# Altium integrated library ISSI SRAM QUAD(P).IntLib: 1732 symbols (part 138 of 1459)
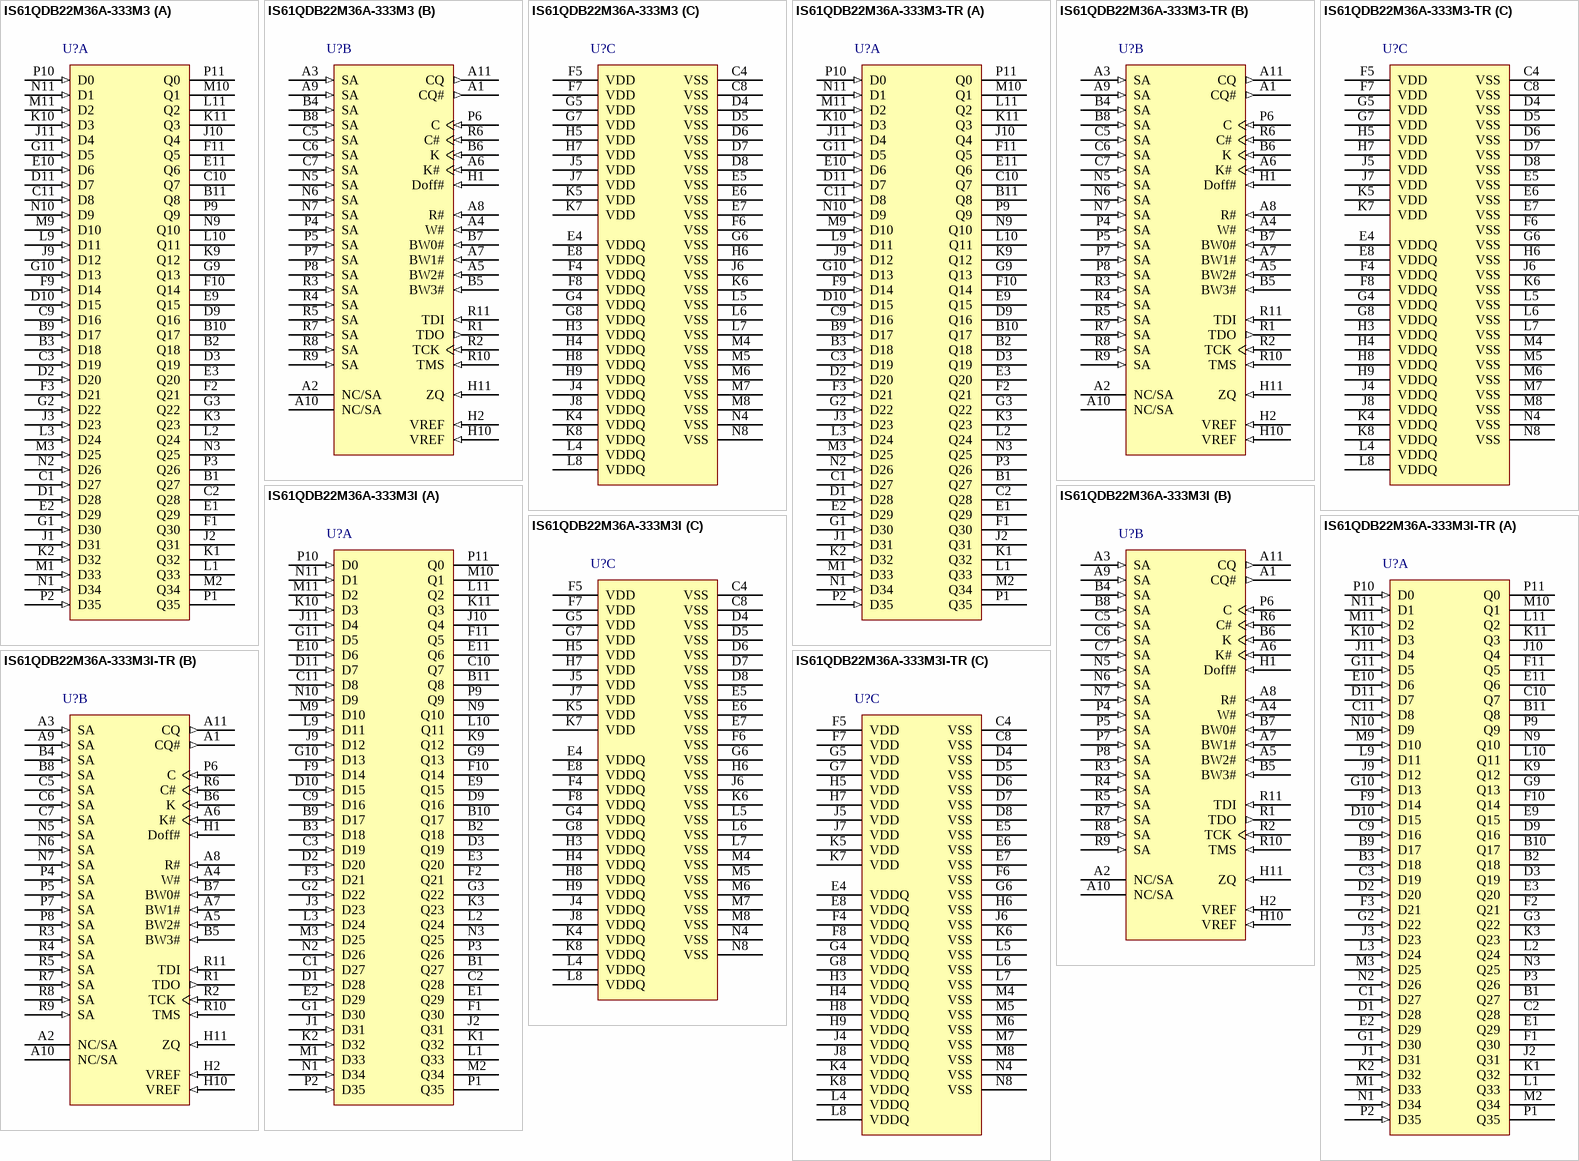
[diagram p536: symbols IS61QDB22M36A-333M3 to IS61QDB22M36A-333M3I-TR]

## IS61QDB22M36A-333M3-TR
designator U?
72 M QUAD (Burst 2) Synchronous SRAM, 2 M x 36, 0 to 70 degC, 165-Pin BGA (LF-BGA-165); Manufacturer: Integrated Silicon Solution Inc (ISSI); PartNumber: IS61QDB22M36A-333M3-TR; Burst: 2; Density: 72M; Organization: 2Mx36; Packing: Tape & Reel; DatasheetVersion: Rev. A; PackageVersion: Rev. B, 12/2007; PackageReference: LF-BGA-165; PackageDescription: 165-Pin 15 x 17 mm LF-BGA, Pitch 1 mm; Mounting Technology: Surface Mount; ComponentLink1Description: Manufacturer URL; ComponentLink1URL: http://www.issi.com/US/index.shtml; ComponentLink2Description: Datasheet; ComponentLink2URL: http://www.issi.com/WW/pdf/61QDB24M18A-2M36A.pdf; ComponentLink3Description: Package Specification; ComponentLink3URL: http://www.issi.com/WW/pdf/61QDB41M18A-51236A.pdf
footprint ISSI-LF-BGA-165-15000X17000DE (BGA, 165-Balls, Body 17x15mm, Pitch 1mm)
part A pins: B1 Q27 (hiz) "Synchronous data output: Output data is synchronized to the respective C and C#, or to the respective K and K# if C and /C are tied to high. This bus operates in response to R# commands.See BALL CONFIGURATION figures for (See Datasheet)", B2 Q18 (hiz) "Synchronous data output: Output data is synchronized to the respective C and C#, or to the respective K and K# if C and /C are tied to high. This bus operates in response to R# commands.See BALL CONFIGURATION figures for (See Datasheet)", B3 D18 (in) "Synchronous data input: Input data must meet setup and hold times around the rising edges of K and K# during WRITE operations. See BALL CONFIGURATION figures for ball site location of individual signals.", B9 D17 (in) "Synchronous data input: Input data must meet setup and hold times around the rising edges of K and K# during WRITE operations. See BALL CONFIGURATION figures for ball site location of individual signals.", B10 Q17 (hiz) "Synchronous data output: Output data is synchronized to the respective C and C#, or to the respective K and K# if C and /C are tied to high. This bus operates in response to R# commands.See BALL CONFIGURATION figures for (See Datasheet)", B11 Q8 (hiz) "Synchronous data output: Output data is synchronized to the respective C and C#, or to the respective K and K# if C and /C are tied to high. This bus operates in response to R# commands.See BALL CONFIGURATION figures for (See Datasheet)", C1 D27 (in) "Synchronous data input: Input data must meet setup and hold times around the rising edges of K and K# during WRITE operations. See BALL CONFIGURATION figures for ball site location of individual signals.", C2 Q28 (hiz) "Synchronous data output: Output data is synchronized to the respective C and C#, or to the respective K and K# if C and /C are tied to high. This bus operates in response to R# commands.See BALL CONFIGURATION figures for (See Datasheet)", C3 D19 (in) "Synchronous data input: Input data must meet setup and hold times around the rising edges of K and K# during WRITE operations. See BALL CONFIGURATION figures for ball site location of individual signals.", C9 D16 (in) "Synchronous data input: Input data must meet setup and hold times around the rising edges of K and K# during WRITE operations. See BALL CONFIGURATION figures for ball site location of individual signals.", C10 Q7 (hiz) "Synchronous data output: Output data is synchronized to the respective C and C#, or to the respective K and K# if C and /C are tied to high. This bus operates in response to R# commands.See BALL CONFIGURATION figures for (See Datasheet)", C11 D8 (in) "Synchronous data input: Input data must meet setup and hold times around the rising edges of K and K# during WRITE operations. See BALL CONFIGURATION figures for ball site location of individual signals.", D1 D28 (in) "Synchronous data input: Input data must meet setup and hold times around the rising edges of K and K# during WRITE operations. See BALL CONFIGURATION figures for ball site location of individual signals.", D2 D20 (in) "Synchronous data input: Input data must meet setup and hold times around the rising edges of K and K# during WRITE operations. See BALL CONFIGURATION figures for ball site location of individual signals.", D3 Q19 (hiz) "Synchronous data output: Output data is synchronized to the respective C and C#, or to the respective K and K# if C and /C are tied to high. This bus operates in response to R# commands.See BALL CONFIGURATION figures for (See Datasheet)", D9 Q16 (hiz) "Synchronous data output: Output data is synchronized to the respective C and C#, or to the respective K and K# if C and /C are tied to high. This bus operates in response to R# commands.See BALL CONFIGURATION figures for (See Datasheet)", D10 D15 (in) "Synchronous data input: Input data must meet setup and hold times around the rising edges of K and K# during WRITE operations. See BALL CONFIGURATION figures for ball site location of individual signals.", D11 D7 (in) "Synchronous data input: Input data must meet setup and hold times around the rising edges of K and K# during WRITE operations. See BALL CONFIGURATION figures for ball site location of individual signals.", E1 Q29 (hiz) "Synchronous data output: Output data is synchronized to the respective C and C#, or to the respective K and K# if C and /C are tied to high. This bus operates in response to R# commands.See BALL CONFIGURATION figures for (See Datasheet)", E2 D29 (in) "Synchronous data input: Input data must meet setup and hold times around the rising edges of K and K# during WRITE operations. See BALL CONFIGURATION figures for ball site location of individual signals.", E3 Q20 (hiz) "Synchronous data output: Output data is synchronized to the respective C and C#, or to the respective K and K# if C and /C are tied to high. This bus operates in response to R# commands.See BALL CONFIGURATION figures for (See Datasheet)", E9 Q15 (hiz) "Synchronous data output: Output data is synchronized to the respective C and C#, or to the respective K and K# if C and /C are tied to high. This bus operates in response to R# commands.See BALL CONFIGURATION figures for (See Datasheet)", E10 D6 (in) "Synchronous data input: Input data must meet setup and hold times around the rising edges of K and K# during WRITE operations. See BALL CONFIGURATION figures for ball site location of individual signals.", E11 Q6 (hiz) "Synchronous data output: Output data is synchronized to the respective C and C#, or to the respective K and K# if C and /C are tied to high. This bus operates in response to R# commands.See BALL CONFIGURATION figures for (See Datasheet)", F1 Q30 (hiz) "Synchronous data output: Output data is synchronized to the respective C and C#, or to the respective K and K# if C and /C are tied to high. This bus operates in response to R# commands.See BALL CONFIGURATION figures for (See Datasheet)", F2 Q21 (hiz) "Synchronous data output: Output data is synchronized to the respective C and C#, or to the respective K and K# if C and /C are tied to high. This bus operates in response to R# commands.See BALL CONFIGURATION figures for (See Datasheet)", F3 D21 (in) "Synchronous data input: Input data must meet setup and hold times around the rising edges of K and K# during WRITE operations. See BALL CONFIGURATION figures for ball site location of individual signals.", F9 D14 (in) "Synchronous data input: Input data must meet setup and hold times around the rising edges of K and K# during WRITE operations. See BALL CONFIGURATION figures for ball site location of individual signals.", F10 Q14 (hiz) "Synchronous data output: Output data is synchronized to the respective C and C#, or to the respective K and K# if C and /C are tied to high. This bus operates in response to R# commands.See BALL CONFIGURATION figures for (See Datasheet)", F11 Q5 (hiz) "Synchronous data output: Output data is synchronized to the respective C and C#, or to the respective K and K# if C and /C are tied to high. This bus operates in response to R# commands.See BALL CONFIGURATION figures for (See Datasheet)", G1 D30 (in) "Synchronous data input: Input data must meet setup and hold times around the rising edges of K and K# during WRITE operations. See BALL CONFIGURATION figures for ball site location of individual signals.", G2 D22 (in) "Synchronous data input: Input data must meet setup and hold times around the rising edges of K and K# during WRITE operations. See BALL CONFIGURATION figures for ball site location of individual signals.", G3 Q22 (hiz) "Synchronous data output: Output data is synchronized to the respective C and C#, or to the respective K and K# if C and /C are tied to high. This bus operates in response to R# commands.See BALL CONFIGURATION figures for (See Datasheet)", G9 Q13 (hiz) "Synchronous data output: Output data is synchronized to the respective C and C#, or to the respective K and K# if C and /C are tied to high. This bus operates in response to R# commands.See BALL CONFIGURATION figures for (See Datasheet)", G10 D13 (in) "Synchronous data input: Input data must meet setup and hold times around the rising edges of K and K# during WRITE operations. See BALL CONFIGURATION figures for ball site location of individual signals.", G11 D5 (in) "Synchronous data input: Input data must meet setup and hold times around the rising edges of K and K# during WRITE operations. See BALL CONFIGURATION figures for ball site location of individual signals.", J1 D31 (in) "Synchronous data input: Input data must meet setup and hold times around the rising edges of K and K# during WRITE operations. See BALL CONFIGURATION figures for ball site location of individual signals.", J2 Q31 (hiz) "Synchronous data output: Output data is synchronized to the respective C and C#, or to the respective K and K# if C and /C are tied to high. This bus operates in response to R# commands.See BALL CONFIGURATION figures for (See Datasheet)", J3 D23 (in) "Synchronous data input: Input data must meet setup and hold times around the rising edges of K and K# during WRITE operations. See BALL CONFIGURATION figures for ball site location of individual signals.", J9 D12 (in) "Synchronous data input: Input data must meet setup and hold times around the rising edges of K and K# during WRITE operations. See BALL CONFIGURATION figures for ball site location of individual signals.", J10 Q4 (hiz) "Synchronous data output: Output data is synchronized to the respective C and C#, or to the respective K and K# if C and /C are tied to high. This bus operates in response to R# commands.See BALL CONFIGURATION figures for (See Datasheet)", J11 D4 (in) "Synchronous data input: Input data must meet setup and hold times around the rising edges of K and K# during WRITE operations. See BALL CONFIGURATION figures for ball site location of individual signals.", K1 Q32 (hiz) "Synchronous data output: Output data is synchronized to the respective C and C#, or to the respective K and K# if C and /C are tied to high. This bus operates in response to R# commands.See BALL CONFIGURATION figures for (See Datasheet)", K2 D32 (in) "Synchronous data input: Input data must meet setup and hold times around the rising edges of K and K# during WRITE operations. See BALL CONFIGURATION figures for ball site location of individual signals.", K3 Q23 (hiz) "Synchronous data output: Output data is synchronized to the respective C and C#, or to the respective K and K# if C and /C are tied to high. This bus operates in response to R# commands.See BALL CONFIGURATION figures for (See Datasheet)", K9 Q12 (hiz) "Synchronous data output: Output data is synchronized to the respective C and C#, or to the respective K and K# if C and /C are tied to high. This bus operates in response to R# commands.See BALL CONFIGURATION figures for (See Datasheet)", K10 D3 (in) "Synchronous data input: Input data must meet setup and hold times around the rising edges of K and K# during WRITE operations. See BALL CONFIGURATION figures for ball site location of individual signals.", K11 Q3 (hiz) "Synchronous data output: Output data is synchronized to the respective C and C#, or to the respective K and K# if C and /C are tied to high. This bus operates in response to R# commands.See BALL CONFIGURATION figures for (See Datasheet)", L1 Q33 (hiz) "Synchronous data output: Output data is synchronized to the respective C and C#, or to the respective K and K# if C and /C are tied to high. This bus operates in response to R# commands.See BALL CONFIGURATION figures for (See Datasheet)", L2 Q24 (hiz) "Synchronous data output: Output data is synchronized to the respective C and C#, or to the respective K and K# if C and /C are tied to high. This bus operates in response to R# commands.See BALL CONFIGURATION figures for (See Datasheet)", L3 D24 (in) "Synchronous data input: Input data must meet setup and hold times around the rising edges of K and K# during WRITE operations. See BALL CONFIGURATION figures for ball site location of individual signals.", L9 D11 (in) "Synchronous data input: Input data must meet setup and hold times around the rising edges of K and K# during WRITE operations. See BALL CONFIGURATION figures for ball site location of individual signals.", L10 Q11 (hiz) "Synchronous data output: Output data is synchronized to the respective C and C#, or to the respective K and K# if C and /C are tied to high. This bus operates in response to R# commands.See BALL CONFIGURATION figures for (See Datasheet)", L11 Q2 (hiz) "Synchronous data output: Output data is synchronized to the respective C and C#, or to the respective K and K# if C and /C are tied to high. This bus operates in response to R# commands.See BALL CONFIGURATION figures for (See Datasheet)", M1 D33 (in) "Synchronous data input: Input data must meet setup and hold times around the rising edges of K and K# during WRITE operations. See BALL CONFIGURATION figures for ball site location of individual signals.", M2 Q34 (hiz) "Synchronous data output: Output data is synchronized to the respective C and C#, or to the respective K and K# if C and /C are tied to high. This bus operates in response to R# commands.See BALL CONFIGURATION figures for (See Datasheet)", M3 D25 (in) "Synchronous data input: Input data must meet setup and hold times around the rising edges of K and K# during WRITE operations. See BALL CONFIGURATION figures for ball site location of individual signals.", M9 D10 (in) "Synchronous data input: Input data must meet setup and hold times around the rising edges of K and K# during WRITE operations. See BALL CONFIGURATION figures for ball site location of individual signals.", M10 Q1 (hiz) "Synchronous data output: Output data is synchronized to the respective C and C#, or to the respective K and K# if C and /C are tied to high. This bus operates in response to R# commands.See BALL CONFIGURATION figures for (See Datasheet)", M11 D2 (in) "Synchronous data input: Input data must meet setup and hold times around the rising edges of K and K# during WRITE operations. See BALL CONFIGURATION figures for ball site location of individual signals.", N1 D34 (in) "Synchronous data input: Input data must meet setup and hold times around the rising edges of K and K# during WRITE operations. See BALL CONFIGURATION figures for ball site location of individual signals.", N2 D26 (in) "Synchronous data input: Input data must meet setup and hold times around the rising edges of K and K# during WRITE operations. See BALL CONFIGURATION figures for ball site location of individual signals.", N3 Q25 (hiz) "Synchronous data output: Output data is synchronized to the respective C and C#, or to the respective K and K# if C and /C are tied to high. This bus operates in response to R# commands.See BALL CONFIGURATION figures for (See Datasheet)", N9 Q10 (hiz) "Synchronous data output: Output data is synchronized to the respective C and C#, or to the respective K and K# if C and /C are tied to high. This bus operates in response to R# commands.See BALL CONFIGURATION figures for (See Datasheet)", N10 D9 (in) "Synchronous data input: Input data must meet setup and hold times around the rising edges of K and K# during WRITE operations. See BALL CONFIGURATION figures for ball site location of individual signals.", N11 D1 (in) "Synchronous data input: Input data must meet setup and hold times around the rising edges of K and K# during WRITE operations. See BALL CONFIGURATION figures for ball site location of individual signals.", P1 Q35 (hiz) "Synchronous data output: Output data is synchronized to the respective C and C#, or to the respective K and K# if C and /C are tied to high. This bus operates in response to R# commands.See BALL CONFIGURATION figures for (See Datasheet)", P2 D35 (in) "Synchronous data input: Input data must meet setup and hold times around the rising edges of K and K# during WRITE operations. See BALL CONFIGURATION figures for ball site location of individual signals.", P3 Q26 (hiz) "Synchronous data output: Output data is synchronized to the respective C and C#, or to the respective K and K# if C and /C are tied to high. This bus operates in response to R# commands.See BALL CONFIGURATION figures for (See Datasheet)", P9 Q9 (hiz) "Synchronous data output: Output data is synchronized to the respective C and C#, or to the respective K and K# if C and /C are tied to high. This bus operates in response to R# commands.See BALL CONFIGURATION figures for (See Datasheet)", P10 D0 (in) "Synchronous data input: Input data must meet setup and hold times around the rising edges of K and K# during WRITE operations. See BALL CONFIGURATION figures for ball site location of individual signals.", P11 Q0 (hiz) "Synchronous data output: Output data is synchronized to the respective C and C#, or to the respective K and K# if C and /C are tied to high. This bus operates in response to R# commands.See BALL CONFIGURATION figures for (See Datasheet)"
part B pins: A1 CQ# (out) "Synchronous echo clock output: The edges of this output are tightly matched to the synchronous data outputs and can be used as a data valid indication. These signals are free running clocks and do not stop when Q tri-states.", A2 NC/SA, A3 SA (in) "Synchronous address input: This input is registered and must meet the setup and hold times around the rising edge of K. This input is ignored when device is deselected.", A4 W# (in) "Synchronous write: When low, this input causes the address inputs to be registered and a WRITE cycle to be initiated. This input must meet setup and hold times around the rising edge of K.", A5 BW2# (in) "Synchronous byte write: When low, these inputs cause their respective byte to be registered and written during WRITE cycles. These signals are sampled on the same edge as the corresponding data and must meet setup and hold (See Datasheet)", A6 K# (in) "Input clock: This input clock pair registers address and control inputs on the rising edge of K, and registers data on the rising edge of K and the rising edge of K#. K# is ideally 180 degrees out of phase with K. All (See Datasheet)", A7 BW1# (in) "Synchronous byte write: When low, these inputs cause their respective byte to be registered and written during WRITE cycles. These signals are sampled on the same edge as the corresponding data and must meet setup and hold (See Datasheet)", A8 R# (in) "Synchronous read: When low, this input causes the address inputs to be registered and a READ cycle to be initiated. This input must meet setup and hold times around the rising edge of K.", A9 SA (in) "Synchronous address input: This input is registered and must meet the setup and hold times around the rising edge of K. This input is ignored when device is deselected.", A10 NC/SA, A11 CQ (out) "Synchronous echo clock output: The edges of this output are tightly matched to the synchronous data outputs and can be used as a data valid indication. These signals are free running clocks and do not stop when Q tri-states.", B4 SA (in) "Synchronous address input: This input is registered and must meet the setup and hold times around the rising edge of K. This input is ignored when device is deselected.", B5 BW3# (in) "Synchronous byte write: When low, these inputs cause their respective byte to be registered and written during WRITE cycles. These signals are sampled on the same edge as the corresponding data and must meet setup and hold (See Datasheet)", B6 K (in) "Input clock: This input clock pair registers address and control inputs on the rising edge of K, and registers data on the rising edge of K and the rising edge of K#. K# is ideally 180 degrees out of phase with K. All (See Datasheet)", B7 BW0# (in) "Synchronous byte write: When low, these inputs cause their respective byte to be registered and written during WRITE cycles. These signals are sampled on the same edge as the corresponding data and must meet setup and hold (See Datasheet)", B8 SA (in) "Synchronous address input: This input is registered and must meet the setup and hold times around the rising edge of K. This input is ignored when device is deselected.", C5 SA (in) "Synchronous address input: This input is registered and must meet the setup and hold times around the rising edge of K. This input is ignored when device is deselected.", C6 SA (in) "Synchronous address input: This input is registered and must meet the setup and hold times around the rising edge of K. This input is ignored when device is deselected.", C7 SA (in) "Synchronous address input: This input is registered and must meet the setup and hold times around the rising edge of K. This input is ignored when device is deselected.", H1 Doff# (in) "DLL disable and reset input : when low, this input causes the DLL to be bypassed and reset the previous DLL information. When high, DLL will start operating and lock the frequency after tCK lock time. The device behaves in (See Datasheet)", H2 VREF (in) "HSTL input reference voltage: Nominally VDDQ/2, but may be adjusted to improve system noise margin. Provides a reference voltage for the HSTL input buffers.", H10 VREF (in) "HSTL input reference voltage: Nominally VDDQ/2, but may be adjusted to improve system noise margin. Provides a reference voltage for the HSTL input buffers.", H11 ZQ (in) "Output impedance matching input: This input is used to tune the device outputs to the system data bus impedance. Q and CQ output impedance are set to 0.2xRQ, where RQ is a resistor from this ball to ground. This ball can be (See Datasheet)", N5 SA (in) "Synchronous address input: This input is registered and must meet the setup and hold times around the rising edge of K. This input is ignored when device is deselected.", N6 SA (in) "Synchronous address input: This input is registered and must meet the setup and hold times around the rising edge of K. This input is ignored when device is deselected.", N7 SA (in) "Synchronous address input: This input is registered and must meet the setup and hold times around the rising edge of K. This input is ignored when device is deselected.", P4 SA (in) "Synchronous address input: This input is registered and must meet the setup and hold times around the rising edge of K. This input is ignored when device is deselected.", P5 SA (in) "Synchronous address input: This input is registered and must meet the setup and hold times around the rising edge of K. This input is ignored when device is deselected.", P6 C (in) "Input clock for output data. C and C# are used to clock out the READ data. They can be used together to deskew the flight times of various devices on the board back to the controller. See application example for further (See Datasheet)", P7 SA (in) "Synchronous address input: This input is registered and must meet the setup and hold times around the rising edge of K. This input is ignored when device is deselected.", P8 SA (in) "Synchronous address input: This input is registered and must meet the setup and hold times around the rising edge of K. This input is ignored when device is deselected.", R1 TDO (out) "IEEE1149.1 output pin for JTAG.", R2 TCK (in) "IEEE1149.1 input pin for JTAG.", R3 SA (in) "Synchronous address input: This input is registered and must meet the setup and hold times around the rising edge of K. This input is ignored when device is deselected.", R4 SA (in) "Synchronous address input: This input is registered and must meet the setup and hold times around the rising edge of K. This input is ignored when device is deselected.", R5 SA (in) "Synchronous address input: This input is registered and must meet the setup and hold times around the rising edge of K. This input is ignored when device is deselected.", R6 C# (in) "Input clock for output data. C and C# are used to clock out the READ data. They can be used together to deskew the flight times of various devices on the board back to the controller. See application example for further (See Datasheet)", R7 SA (in) "Synchronous address input: This input is registered and must meet the setup and hold times around the rising edge of K. This input is ignored when device is deselected.", R8 SA (in) "Synchronous address input: This input is registered and must meet the setup and hold times around the rising edge of K. This input is ignored when device is deselected.", R9 SA (in) "Synchronous address input: This input is registered and must meet the setup and hold times around the rising edge of K. This input is ignored when device is deselected.", R10 TMS (in) "IEEE1149.1 input pin for JTAG.", R11 TDI (in) "IEEE1149.1 input pin for JTAG."
part C pins: C4 VSS (power) "Ground of the device", C8 VSS (power) "Ground of the device", D4 VSS (power) "Ground of the device", D5 VSS (power) "Ground of the device", D6 VSS (power) "Ground of the device", D7 VSS (power) "Ground of the device", D8 VSS (power) "Ground of the device", E4 VDDQ (power) "Power supply: Isolated output buffer supply. Nominally 1.5 V. See DC Characteristics and Operating Conditions for range.", E5 VSS (power) "Ground of the device", E6 VSS (power) "Ground of the device", E7 VSS (power) "Ground of the device", E8 VDDQ (power) "Power supply: Isolated output buffer supply. Nominally 1.5 V. See DC Characteristics and Operating Conditions for range.", F4 VDDQ (power) "Power supply: Isolated output buffer supply. Nominally 1.5 V. See DC Characteristics and Operating Conditions for range.", F5 VDD (power) "Power supply: 1.8 V nominal. See DC Characteristics and Operating Conditions for range.", F6 VSS (power) "Ground of the device", F7 VDD (power) "Power supply: 1.8 V nominal. See DC Characteristics and Operating Conditions for range.", F8 VDDQ (power) "Power supply: Isolated output buffer supply. Nominally 1.5 V. See DC Characteristics and Operating Conditions for range.", G4 VDDQ (power) "Power supply: Isolated output buffer supply. Nominally 1.5 V. See DC Characteristics and Operating Conditions for range.", G5 VDD (power) "Power supply: 1.8 V nominal. See DC Characteristics and Operating Conditions for range.", G6 VSS (power) "Ground of the device", G7 VDD (power) "Power supply: 1.8 V nominal. See DC Characteristics and Operating Conditions for range.", G8 VDDQ (power) "Power supply: Isolated output buffer supply. Nominally 1.5 V. See DC Characteristics and Operating Conditions for range.", H3 VDDQ (power) "Power supply: Isolated output buffer supply. Nominally 1.5 V. See DC Characteristics and Operating Conditions for range.", H4 VDDQ (power) "Power supply: Isolated output buffer supply. Nominally 1.5 V. See DC Characteristics and Operating Conditions for range.", H5 VDD (power) "Power supply: 1.8 V nominal. See DC Characteristics and Operating Conditions for range.", H6 VSS (power) "Ground of the device", H7 VDD (power) "Power supply: 1.8 V nominal. See DC Characteristics and Operating Conditions for range.", H8 VDDQ (power) "Power supply: Isolated output buffer supply. Nominally 1.5 V. See DC Characteristics and Operating Conditions for range.", H9 VDDQ (power) "Power supply: Isolated output buffer supply. Nominally 1.5 V. See DC Characteristics and Operating Conditions for range.", J4 VDDQ (power) "Power supply: Isolated output buffer supply. Nominally 1.5 V. See DC Characteristics and Operating Conditions for range.", J5 VDD (power) "Power supply: 1.8 V nominal. See DC Characteristics and Operating Conditions for range.", J6 VSS (power) "Ground of the device", J7 VDD (power) "Power supply: 1.8 V nominal. See DC Characteristics and Operating Conditions for range.", J8 VDDQ (power) "Power supply: Isolated output buffer supply. Nominally 1.5 V. See DC Characteristics and Operating Conditions for range.", K4 VDDQ (power) "Power supply: Isolated output buffer supply. Nominally 1.5 V. See DC Characteristics and Operating Conditions for range.", K5 VDD (power) "Power supply: 1.8 V nominal. See DC Characteristics and Operating Conditions for range.", K6 VSS (power) "Ground of the device", K7 VDD (power) "Power supply: 1.8 V nominal. See DC Characteristics and Operating Conditions for range.", K8 VDDQ (power) "Power supply: Isolated output buffer supply. Nominally 1.5 V. See DC Characteristics and Operating Conditions for range.", L4 VDDQ (power) "Power supply: Isolated output buffer supply. Nominally 1.5 V. See DC Characteristics and Operating Conditions for range.", L5 VSS (power) "Ground of the device", L6 VSS (power) "Ground of the device", L7 VSS (power) "Ground of the device", L8 VDDQ (power) "Power supply: Isolated output buffer supply. Nominally 1.5 V. See DC Characteristics and Operating Conditions for range.", M4 VSS (power) "Ground of the device", M5 VSS (power) "Ground of the device", M6 VSS (power) "Ground of the device", M7 VSS (power) "Ground of the device", M8 VSS (power) "Ground of the device", N4 VSS (power) "Ground of the device", N8 VSS (power) "Ground of the device"